# Altium footprint library Global Library.PcbLib: 82 footprints (part 5 of 6)
Each footprint in its own frame and in the unit in brackets; x right, y up, seen from the top. Pads: shape width x height; smd on the part's side, far side on the other; paste and mask are expansions set on the pad; w line width, h text height; cw(c..) or ccw(c..) is an arc to the next point about the centre after c.
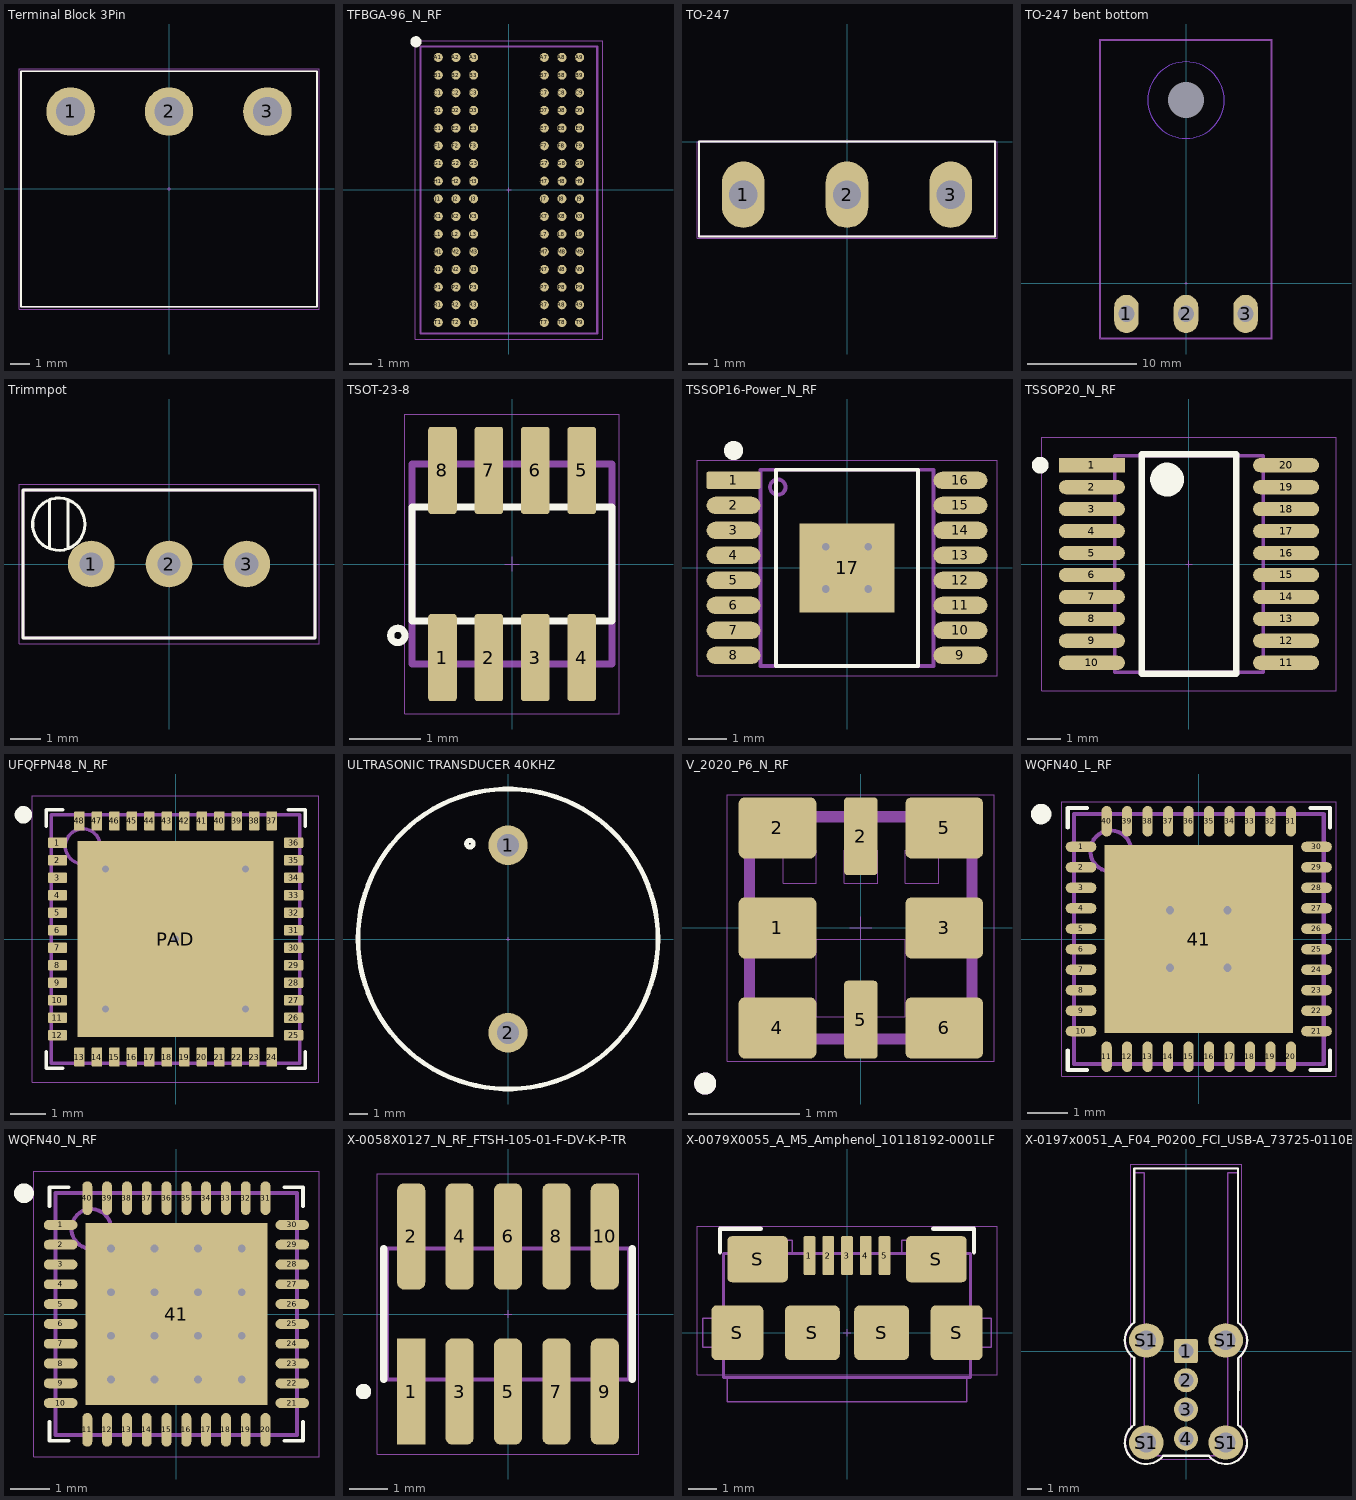
[diagram p4: the footprints below, top view; thin cyan lines are the x and y axes]

## Terminal Block 3Pin [mm]
pads (3):
  round 2.5 hole 1.5: 1(-5.08,4) 2(0,4) 3(5.08,4)
Top Overlay:
  lines w0.1: -7.64,-6.075 7.64,-6.075 7.64,6.075 -7.64,6.075 -7.64,-6.075
Top Courtyard:
  lines w0.01: -0.1,0 0.1,0 ; 0,-0.1 0,0.1 ; -7.74,-6.2 -7.74,6.2 7.74,6.2 7.74,-6.2 -7.74,-6.2
Top Assembly:
  lines w0.1: -7.64,-6.075 7.64,-6.075 7.64,6.075 -7.64,6.075 -7.64,-6.075
Top Assy THT:
  lines w0.1: -7.64,-6.075 7.64,-6.075 7.64,6.075 -7.64,6.075 -7.64,-6.075
  text ".Designator" at -8,-6 h1
3D body "691312510003 (rev1).stp": height 8.45, standoff -3.55, extent -7.62,-6 7.62,6

## TFBGA-96_N_RF [mm] "BGA, 96-Leads, Body 8.00x13.00mmx1.20mm, Pitch 0.80mm"
height 1.2
pads (96):
  round 0.41 smd: A1(-3.2,6) A2(-2.4,6) A3(-1.6,6) A7(1.6,6) A8(2.4,6) A9(3.2,6) B1(-3.2,5.2) B2(-2.4,5.2) B3(-1.6,5.2) B7(1.6,5.2) B8(2.4,5.2) B9(3.2,5.2) C1(-3.2,4.4) C2(-2.4,4.4) C3(-1.6,4.4) C7(1.6,4.4) C8(2.4,4.4) C9(3.2,4.4) D1(-3.2,3.6) D2(-2.4,3.6) D3(-1.6,3.6) D7(1.6,3.6) D8(2.4,3.6) D9(3.2,3.6) E1(-3.2,2.8) E2(-2.4,2.8) E3(-1.6,2.8) E7(1.6,2.8) E8(2.4,2.8) E9(3.2,2.8) F1(-3.2,2) F2(-2.4,2) F3(-1.6,2) F7(1.6,2) F8(2.4,2) F9(3.2,2) G1(-3.2,1.2) G2(-2.4,1.2) G3(-1.6,1.2) G7(1.6,1.2) G8(2.4,1.2) G9(3.2,1.2) H1(-3.2,0.4) H2(-2.4,0.4) H3(-1.6,0.4) H7(1.6,0.4) H8(2.4,0.4) H9(3.2,0.4) J1(-3.2,-0.4) J2(-2.4,-0.4) J3(-1.6,-0.4) J7(1.6,-0.4) J8(2.4,-0.4) J9(3.2,-0.4) K1(-3.2,-1.2) K2(-2.4,-1.2) K3(-1.6,-1.2) K7(1.6,-1.2) K8(2.4,-1.2) K9(3.2,-1.2) L1(-3.2,-2) L2(-2.4,-2) L3(-1.6,-2) L7(1.6,-2) L8(2.4,-2) L9(3.2,-2) M1(-3.2,-2.8) M2(-2.4,-2.8) M3(-1.6,-2.8) M7(1.6,-2.8) M8(2.4,-2.8) M9(3.2,-2.8) N1(-3.2,-3.6) N2(-2.4,-3.6) N3(-1.6,-3.6) N7(1.6,-3.6) N8(2.4,-3.6) N9(3.2,-3.6) P1(-3.2,-4.4) P2(-2.4,-4.4) P3(-1.6,-4.4) P7(1.6,-4.4) P8(2.4,-4.4) P9(3.2,-4.4) R1(-3.2,-5.2) R2(-2.4,-5.2) R3(-1.6,-5.2) R7(1.6,-5.2) R8(2.4,-5.2) R9(3.2,-5.2) T1(-3.2,-6) T2(-2.4,-6) T3(-1.6,-6) T7(1.6,-6) T8(2.4,-6) T9(3.2,-6)
Top Overlay:
  circle w0.25: c-4.21,6.71 r0.125
Top Courtyard:
  lines w0.01: -0.1,0 0.1,0 ; 0,-0.1 0,0.1 ; -4.25,-6.75 4.25,-6.75 4.25,6.75 -4.25,6.75 -4.25,-6.75
Top Assembly:
  lines w0.1: -4,-6.5 4,-6.5 4,6.5 -4,6.5 -4,-6.5
Top Assy SMT:
  lines w0.1: -4,-6.5 -4,6.5 4,6.5 4,-6.5 -4,-6.5
  text ".Designator" at -4.135,6.875 h1
3D body "TFBGA-96_N_RF.step": height 1.2, standoff 0, extent -4,-6.5 4,6.5

## TO-247 [mm]
pads (3):
  oval 2.25x3.5 hole 1.5: 1(-5.46,-2.8) 2(0,-2.8) 3(5.46,-2.8)
Top Overlay:
  lines w0.1: -7.8,-5 -7.8,0 7.8,0 7.8,-5 -7.8,-5
Top Courtyard:
  lines w0.01: -0.1,0 0.1,0 ; 0,-0.1 0,0.1 ; -7.9,-5.1 7.9,-5.1 7.9,0 -7.9,0 -7.9,-5.1
Top Assembly:
  lines w0.1: -7.8,-5 7.8,-5 7.8,0 -7.8,0 -7.8,-5
Top Assy THT:
  lines w0.1: -7.8,-5 7.8,-5 7.8,0 -7.8,0 -7.8,-5
  text ".Designator" at -7.7,-5.8 h1
3D body "TO-247_factory.stp": height 28.3, standoff -14.4, extent -7.8,-5 7.8,0

## TO-247 bent bottom [mm]
pads (4):
  oval 2.25x3.5 hole 1.5: 1(-5.46,-2.8) 2(0,-2.8) 3(5.46,-2.8)
  round 0 hole 3.3 unplated: ""(0,16.8)
Top Layer keep-out:
  circle w0.1: c0,16.8 r3.5
Bottom Layer keep-out:
  circle w0.1: c0,16.8 r3.5
Bottom Overlay:
  lines w0.1: -7.8,-5 7.8,-5 7.8,22.3 -7.8,22.3 -7.8,-5
Top Courtyard:
  lines w0.01: -0.1,0 0.1,0 ; 0,-0.1 0,0.1 ; -7.9,-5.1 -7.9,22.4 7.9,22.4 7.9,-5.1 -7.9,-5.1
Top Assembly:
  lines w0.1: -7.8,-5 -7.8,22.3 7.8,22.3 7.8,-5 -7.8,-5
Top Assy THT:
  lines w0.1: -7.8,-5 -7.8,22.3 7.8,22.3 7.8,-5 -7.8,-5
  text ".Designator" at -7.7,-5.8 h1
3D body "User Library-TO-247H.step": height 6.4, standoff -5.5, extent -7.75,-3.1 7.75,22.3

## Trimmpot [mil]
pads (3):
  round 60 hole 30: 1(-100,0) 2(0,0) 3(100,0)
Top Overlay:
  circle w3.94: c-141.73,51.18 r33.64
  lines w3.94: -153.54,19.68 -153.54,82.68 ; -129.92,19.68 -129.92,82.68 ; -187.6,-95.08 187.6,-95.08 187.6,95.08 -187.6,95.08 -187.6,-95.08
Top Courtyard:
  lines w0.39: -3.94,0 3.94,0 ; 0,-3.94 0,3.94 ; -192.91,-102.36 192.91,-102.36 192.91,102.36 -192.91,102.36 -192.91,-102.36
Top Assembly:
  lines w3.94: -187.6,-95.08 187.6,-95.08 187.6,95.08 -187.6,95.08 -187.6,-95.08
Top Assy SMT:
  lines w3.94: -187.6,-95.08 187.6,-95.08 187.6,95.08 -187.6,95.08 -187.6,-95.08
Top Assy THT:
  text ".Designator" at -187.6,110.24 h39.37
3D body "3296w-1-332lf.stp": height 233.61, standoff -473.39, extent -187.5,-94.49 187.5,95.51

## TSOT-23-8 [mm]
pads (8):
  rrect20% 0.4x1.22 smd: 1(-0.975,-1.31) 2(-0.325,-1.31) 3(0.325,-1.31) 4(0.975,-1.31) 5(0.975,1.31) 6(0.325,1.31) 7(-0.325,1.31) 8(-0.975,1.31)
Top Overlay:
  circle w0.1: c-1.6,-1 r0.1
  lines w0.1: -1.4,-0.8 -1.4,0.8 1.4,0.8 1.4,-0.8 -1.4,-0.8
Top Courtyard:
  lines w0.01: -0.1,0 0.1,0 ; 0,-0.1 0,0.1 ; -1.5,-2.1 1.5,-2.1 1.5,2.1 -1.5,2.1 -1.5,-2.1
Top Assembly:
  lines w0.1: -1.4,-1.4 1.4,-1.4 1.4,1.4 -1.4,1.4 -1.4,-1.4
Top Assy SMT:
  lines w0.1: -1.4,-1.4 -1.4,1.4 1.4,1.4 1.4,-1.4 -1.4,-1.4
  text ".Designator" at -1.136,-0.283 h1
3D body "TSOT-8.step": height 1, standoff 0, extent -1.45,-1.4 1.45,1.4

## TSSOP16-Power_N_RF [mm] "TSSOP, 16-Leads, Body 5.00x4.40mm, Pitch 0.65mm, Thermal Pad 2.31x2.46mm, IPC Medium Density"
height 1.2
pads (17):
  rrect20% 1.4x0.45 smd: 1(-2.95,2.275)
  oval 1.4x0.45 smd: 2(-2.95,1.625) 3(-2.95,0.975) 4(-2.95,0.325) 5(-2.95,-0.325) 6(-2.95,-0.975) 7(-2.95,-1.625) 8(-2.95,-2.275) 9(2.95,-2.275) 10(2.95,-1.625) 11(2.95,-0.975) 12(2.95,-0.325) 13(2.95,0.325) 14(2.95,0.975) 15(2.95,1.625) 16(2.95,2.275)
  rect 2.46x2.31 smd: 17(0,0)
via -0.55,0.55 diameter 0.5 hole 0.2
via 0.55,0.55 diameter 0.5 hole 0.2
via -0.55,-0.55 diameter 0.5 hole 0.2
via 0.55,-0.55 diameter 0.5 hole 0.2
Top Overlay:
  circle w0.25: c-2.95,3.05 r0.125
  lines w0.1: -1.85,-2.55 -1.85,2.55 1.85,2.55 1.85,-2.55 -1.85,-2.55
Top Courtyard:
  lines w0.01: -0.1,0 0.1,0 ; 0,-0.1 0,0.1 ; -3.9,-2.8 -3.9,2.8 3.9,2.8 3.9,-2.8 -3.9,-2.8
Top Assembly:
  circle w0.1: c-1.8,2.1 r0.2
  lines w0.1: -2.25,-2.55 -2.25,2.55 2.25,2.55 2.25,-2.55 -2.25,-2.55
Top Assy SMT:
  circle w0.1: c-1.8,2.1 r0.2
  lines w0.1: -2.25,-2.55 -2.25,2.55 2.25,2.55 2.25,-2.55 -2.25,-2.55
  text ".Designator" at -2.4,2.988 h1
3D body "TSSOP16-Power_N_RF.step": height 1.2, standoff 0, extent -3.2,-2.55 3.2,2.55

## TSSOP20_N_RF [mm]
height 3
pads (20):
  rect 1.955x0.421 smd mask+0.05: 1(-2.875,2.925)
  rrect100% 1.955x0.421 smd mask+0.05: 2(-2.875,2.275) 3(-2.875,1.625) 4(-2.875,0.975) 5(-2.875,0.325) 6(-2.875,-0.325) 7(-2.875,-0.975) 8(-2.875,-1.625) 9(-2.875,-2.275) 10(-2.875,-2.925) 11(2.875,-2.925) 12(2.875,-2.275) 13(2.875,-1.625) 14(2.875,-0.975) 15(2.875,-0.325) 16(2.875,0.325) 17(2.875,0.975) 18(2.875,1.625) 19(2.875,2.275) 20(2.875,2.925)
Top Overlay:
  circle w0.25: c-4.403,2.925 r0.125
  circle w0.5: c-0.648,2.5 r0.25
  lines w0.2: -1.398,-3.25 -1.398,3.25 1.398,3.25 1.398,-3.25 -1.398,-3.25
Top Courtyard:
  lines w0.01: -0.1,0 0.1,0 ; 0,-0.1 0,0.1 ; -4.353,-3.75 -4.353,3.75 4.353,3.75 4.353,-3.75 -4.353,-3.75
Top Assembly:
  lines w0.1: -2.2,-3.2 -2.2,3.2 2.2,3.2 2.2,-3.2 -2.2,-3.2
Top Assy SMT:
  lines w0.1: -2.2,-3.2 -2.2,3.2 2.2,3.2 2.2,-3.2 -2.2,-3.2
  text ".Designator" at -1.8,3.488 h1
3D body "IC_STMicroelectronics_STM32G030F6P6_eec.STEP": height 0.25, standoff 0, extent -4.353,-3.75 4.353,3.75

## UFQFPN48_N_RF [mm] "QFN, 48-Leads, Body 7.00x7.00mm, Pitch 0.50mm, Thermal Pad 5.60x5.60mm, IPC Medium Density"
height 0.6
pads (49):
  rrect20% 0.55x0.3 smd: 1(-3.375,2.75) 2(-3.375,2.25) 3(-3.375,1.75) 4(-3.375,1.25) 5(-3.375,0.75) 6(-3.375,0.25) 7(-3.375,-0.25) 8(-3.375,-0.75) 9(-3.375,-1.25) 10(-3.375,-1.75) 11(-3.375,-2.25) 12(-3.375,-2.75) 25(3.375,-2.75) 26(3.375,-2.25) 27(3.375,-1.75) 28(3.375,-1.25) 29(3.375,-0.75) 30(3.375,-0.25) 31(3.375,0.25) 32(3.375,0.75) 33(3.375,1.25) 34(3.375,1.75) 35(3.375,2.25) 36(3.375,2.75)
  rrect20% 0.3x0.55 smd: 13(-2.75,-3.375) 14(-2.25,-3.375) 15(-1.75,-3.375) 16(-1.25,-3.375) 17(-0.75,-3.375) 18(-0.25,-3.375) 19(0.25,-3.375) 20(0.75,-3.375) 21(1.25,-3.375) 22(1.75,-3.375) 23(2.25,-3.375) 24(2.75,-3.375) 37(2.75,3.375) 38(2.25,3.375) 39(1.75,3.375) 40(1.25,3.375) 41(0.75,3.375) 42(0.25,3.375) 43(-0.25,3.375) 44(-0.75,3.375) 45(-1.25,3.375) 46(-1.75,3.375) 47(-2.25,3.375) 48(-2.75,3.375)
  rect 5.6x5.6 smd: PAD(0,0)
via 0,0 diameter 0.5 hole 0.2
via -2,-2 diameter 0.5 hole 0.2
via 2,-2 diameter 0.5 hole 0.2
via 2,2 diameter 0.5 hole 0.2
via -2,2 diameter 0.5 hole 0.2
Top Overlay:
  circle w0.25: c-4.35,3.55 r0.125
  lines w0.1: -3.7,-3.225 -3.7,-3.7 -3.225,-3.7 ; -3.7,3.225 -3.7,3.7 -3.225,3.7 ; 3.225,-3.7 3.7,-3.7 3.7,-3.225 ; 3.225,3.7 3.7,3.7 3.7,3.225
Top Courtyard:
  lines w0.01: -0.1,0 0.1,0 ; 0,-0.1 0,0.1 ; -4.1,-4.1 -4.1,4.1 4.1,4.1 4.1,-4.1 -4.1,-4.1
Top Assembly:
  circle w0.1: c-2.65,2.65 r0.5
  lines w0.1: -3.55,-3.55 -3.55,3.55 3.55,3.55 3.55,-3.55 -3.55,-3.55
Top Assy SMT:
  text ".Designator" at -3.835,4.275 h1
3D body "UFQFPN48_N_RF.step": height 0.6, standoff 0, extent -3.551,-3.551 3.551,3.551

## ULTRASONIC TRANSDUCER 40KHZ [mm]
pads (2):
  round 2.1 hole 1.2: 1(0,5) 2(0,-5)
Top Overlay:
  circle w0.254: c0,0 r8
  circle w0.254: c-2.032,5.08 r0.18
Top Courtyard:
  circle w0.01: c0,0 r8
  lines w0.01: -0.1,0 0.1,0 ; 0,-0.1 0,0.1

## V_2020_P6_N_RF [mm] "APA102C LED"
pads (8):
  rrect20% 0.7x0.55 smd mask+0.05: 1(-0.75,0) 2(-0.75,0.9) 3(0.75,0) 4(-0.75,-0.9) 5(0.75,0.9) 6(0.75,-0.9)
  rrect20% 0.3x0.7 smd mask+0.05: 2(0,0.825) 5(0,-0.825)
Top Overlay:
  circle w0.1: c-1.4,-1.4 r0.049
Top Courtyard:
  lines w0.01: -0.1,0 0.1,0 ; 0,-0.1 0,0.1 ; -1.2,-1.2 1.2,-1.2 1.2,1.2 -1.2,1.2 -1.2,-1.2
Top Assembly:
  circle w0.1: c-1.4,-1.4 r0.049
  lines w0.01: -0.7,0.4 -0.7,0.7 -0.4,0.7 -0.4,0.4 -0.7,0.4 ; -0.4,-0.8 -0.4,-0.1 0.4,-0.1 0.4,-0.8 -0.4,-0.8 ; -0.15,0.4 -0.15,0.7 0.15,0.7 0.15,0.4 -0.15,0.4 ; 0.4,0.4 0.4,0.7 0.7,0.7 0.7,0.4 0.4,0.4
  lines w0.1: -1,-1 1,-1 1,1 -1,1 -1,-1
Top Assy SMT:
  circle w0.1: c-1.4,-1.4 r0.049
  lines w0.1: -1,-1 -1,1 1,1 1,-1 -1,-1
  text ".Designator" at -1.1,1.5 h1
3D body: height 0.15, standoff 0, extent -1,-1 1,1
3D body: height 0.6, standoff 0.15, extent -1,-1 1,1

## WQFN40_L_RF [mm] "QFN, 40-Leads, Body 6.00x6.00mm, Pitch 0.50mm, Thermal Pad 4.60x4.60mm, IPC High Density"
height 0.8
pads (41):
  oval 0.75x0.25 smd: 1(-2.875,2.25) 2(-2.875,1.75) 3(-2.875,1.25) 4(-2.875,0.75) 5(-2.875,0.25) 6(-2.875,-0.25) 7(-2.875,-0.75) 8(-2.875,-1.25) 9(-2.875,-1.75) 10(-2.875,-2.25) 21(2.875,-2.25) 22(2.875,-1.75) 23(2.875,-1.25) 24(2.875,-0.75) 25(2.875,-0.25) 26(2.875,0.25) 27(2.875,0.75) 28(2.875,1.25) 29(2.875,1.75) 30(2.875,2.25)
  oval 0.25x0.75 smd: 11(-2.25,-2.875) 12(-1.75,-2.875) 13(-1.25,-2.875) 14(-0.75,-2.875) 15(-0.25,-2.875) 16(0.25,-2.875) 17(0.75,-2.875) 18(1.25,-2.875) 19(1.75,-2.875) 20(2.25,-2.875) 31(2.25,2.875) 32(1.75,2.875) 33(1.25,2.875) 34(0.75,2.875) 35(0.25,2.875) 36(-0.25,2.875) 37(-0.75,2.875) 38(-1.25,2.875) 39(-1.75,2.875) 40(-2.25,2.875)
  rect 4.6x4.6 smd: 41(0,0)
via -0.7,-0.7 diameter 0.55 hole 0.2
via 0.7,0.7 diameter 0.55 hole 0.2
via 0.7,-0.7 diameter 0.55 hole 0.2
via -0.7,0.7 diameter 0.55 hole 0.2
Top Overlay:
  circle w0.25: c-3.85,3.05 r0.125
  lines w0.1: -3.2,-2.725 -3.2,-3.2 -2.725,-3.2 ; -3.2,2.725 -3.2,3.2 -2.725,3.2 ; 2.725,-3.2 3.2,-3.2 3.2,-2.725 ; 2.725,3.2 3.2,3.2 3.2,2.725
Top Courtyard:
  lines w0.01: -0.1,0 0.1,0 ; 0,-0.1 0,0.1 ; -3.35,-3.35 3.35,-3.35 3.35,3.35 -3.35,3.35 -3.35,-3.35
Top Assembly:
  circle w0.1: c-2.15,2.15 r0.5
  lines w0.1: -3.05,-3.05 3.05,-3.05 3.05,3.05 -3.05,3.05 -3.05,-3.05
Top Assy SMT:
  text ".Designator" at -3.342,3.579 h1
3D body "WQFN40_L_RF.step": height 0.8, standoff 0, extent -3.051,-3.051 3.051,3.051

## WQFN40_N_RF [mm] "QFN, 40-Leads, Body 6.00x6.00mm, Pitch 0.50mm, Thermal Pad 4.60x4.60mm, IPC Medium Density"
height 0.8
pads (41):
  oval 0.85x0.25 smd: 1(-2.925,2.25) 2(-2.925,1.75) 3(-2.925,1.25) 4(-2.925,0.75) 5(-2.925,0.25) 6(-2.925,-0.25) 7(-2.925,-0.75) 8(-2.925,-1.25) 9(-2.925,-1.75) 10(-2.925,-2.25) 21(2.925,-2.25) 22(2.925,-1.75) 23(2.925,-1.25) 24(2.925,-0.75) 25(2.925,-0.25) 26(2.925,0.25) 27(2.925,0.75) 28(2.925,1.25) 29(2.925,1.75) 30(2.925,2.25)
  oval 0.25x0.85 smd: 11(-2.25,-2.925) 12(-1.75,-2.925) 13(-1.25,-2.925) 14(-0.75,-2.925) 15(-0.25,-2.925) 16(0.25,-2.925) 17(0.75,-2.925) 18(1.25,-2.925) 19(1.75,-2.925) 20(2.25,-2.925) 31(2.25,2.925) 32(1.75,2.925) 33(1.25,2.925) 34(0.75,2.925) 35(0.25,2.925) 36(-0.25,2.925) 37(-0.75,2.925) 38(-1.25,2.925) 39(-1.75,2.925) 40(-2.25,2.925)
  rect 4.6x4.6 smd: 41(0,0)
via 1.65,-1.65 diameter 0.5 hole 0.2
via 0.55,-1.65 diameter 0.5 hole 0.2
via -0.55,-1.65 diameter 0.5 hole 0.2
via -1.65,-1.65 diameter 0.5 hole 0.2
via 1.65,-0.55 diameter 0.5 hole 0.2
via 0.55,-0.55 diameter 0.5 hole 0.2
via -0.55,-0.55 diameter 0.5 hole 0.2
via -1.65,-0.55 diameter 0.5 hole 0.2
via 1.65,0.55 diameter 0.5 hole 0.2
via 0.55,0.55 diameter 0.5 hole 0.2
via -0.55,0.55 diameter 0.5 hole 0.2
via -1.65,0.55 diameter 0.5 hole 0.2
via 1.65,1.65 diameter 0.5 hole 0.2
via 0.55,1.65 diameter 0.5 hole 0.2
via -0.55,1.65 diameter 0.5 hole 0.2
via -1.65,1.65 diameter 0.5 hole 0.2
Top Overlay:
  circle w0.25: c-3.85,3.05 r0.125
  lines w0.1: -3.2,-2.725 -3.2,-3.2 -2.725,-3.2 ; -3.2,2.725 -3.2,3.2 -2.725,3.2 ; 2.725,-3.2 3.2,-3.2 3.2,-2.725 ; 2.725,3.2 3.2,3.2 3.2,2.725
Top Courtyard:
  lines w0.01: -0.1,0 0.1,0 ; 0,-0.1 0,0.1 ; -3.6,-3.6 3.6,-3.6 3.6,3.6 -3.6,3.6 -3.6,-3.6
Top Assembly:
  circle w0.1: c-2.15,2.15 r0.5
  lines w0.1: -3.05,-3.05 3.05,-3.05 3.05,3.05 -3.05,3.05 -3.05,-3.05
Top Assy SMT:
  text ".Designator" at -3.742,3.779 h1
3D body "WQFN40_N_RF.step": height 0.8, standoff 0, extent -3.051,-3.051 3.051,3.051

## X-0058X0127_N_RF_FTSH-105-01-F-DV-K-P-TR [mm] "2x5 pin connector 1.27mm pitch samtec"
pads (10):
  rect 0.74x2.79 smd: 1(-2.54,-2.035)
  rrect50% 0.74x2.79 smd: 2(-2.54,2.035) 3(-1.27,-2.035) 4(-1.27,2.035) 5(0,-2.035) 6(0,2.035) 7(1.27,-2.035) 8(1.27,2.035) 9(2.54,-2.035) 10(2.54,2.035)
Top Overlay:
  circle w0.2: c-3.79,-2.035 r0.1
  lines w0.2: -3.26,-1.715 -3.26,1.715 ; 3.26,-1.715 3.26,1.715
Top Courtyard:
  lines w0.01: -0.1,0 0.1,0 ; 0,-0.1 0,0.1 ; -3.425,-3.68 -3.425,3.68 3.425,3.68 3.425,-3.68 -3.425,-3.68
Top Assembly:
  circle w0.2: c-3.79,-2.035 r0.1
  lines w0.1: -3.175,-1.715 3.175,-1.715 3.175,1.715 -3.175,1.715 -3.175,-1.715
Top Assy SMT:
  circle w0.2: c-3.79,-2.035 r0.1
  lines w0.1: -3.175,-1.715 3.175,-1.715 3.175,1.715 -3.175,1.715 -3.175,-1.715
  text ".Designator" at 4.424,-3.8 h1.52
3D body "FTSH-105-01-F-DV-K-P.stp": height 6.98, standoff -0.01, extent -3.175,-2.921 3.175,2.921

## X-0079X0055_A_M5_Amphenol_10118192-0001LF [mm]
height 2.7
pads (11):
  rrect20% 0.4x1.35 smd: 1(-1.3,2.675) 2(-0.65,2.675) 3(0,2.675) 4(0.65,2.675) 5(1.3,2.675)
  rrect20% 1.8x1.9 smd: S(-3.8,0) S(3.8,0)
  rrect20% 2.1x1.6 smd: S(-3.1,2.55) S(3.1,2.55)
  rrect20% 1.9x1.9 smd: S(-1.2,0) S(1.2,0)
Top Overlay:
  lines w0.15: -4.4,2.793 -4.4,3.6 -2.99,3.6 ; 2.99,3.6 4.4,3.6 4.4,2.793
Top Courtyard:
  lines w0.01: -0.125,0 0.125,0 ; 0,-0.125 0,0.125 ; -5.2,-1.45 -5.2,3.7 5.2,3.7 5.2,-1.45 -5.2,-1.45
Top Assembly:
  lines w0.05: -4.277,-0.5 -5,-0.5 -5,0.5 -4.25,0.5 ; -4.15,-1.55 -4.15,-2.4 4.15,-2.4 4.15,-1.55 ; -2.4,2.75 -2.4,3.2 -1.896,3.2 -1.896,2.75 ; -1.425,2.75 -1.425,3.2 -1.175,3.2 -1.175,2.75 ; -0.775,2.75 -0.775,3.2 -0.525,3.2 -0.525,2.75 ; -0.125,2.75 -0.125,3.2 0.125,3.2 0.125,2.75 ; 0.525,2.75 0.525,3.2 0.775,3.2 0.775,2.75 ; 1.175,2.75 1.175,3.2 1.425,3.2 1.425,2.75 ; 1.9,2.75 1.9,3.2 2.404,3.2 2.404,2.75 ; 4.277,-0.5 5,-0.5 5,0.5 4.277,0.5
  lines w0.1: -4.277,-1.55 -4.277,2.75 4.277,2.75 4.277,-1.55 -4.277,-1.55
Top Assy SMT:
  lines w0.05: -4.277,-0.5 -5,-0.5 -5,0.5 -4.25,0.5 ; -4.15,-1.55 -4.15,-2.4 4.15,-2.4 4.15,-1.55 ; 4.277,-0.5 5,-0.5 5,0.5 4.277,0.5 ; -2.4,3.2 -2.4,2.75 -2.4,3.2 ; -2.4,3.2 -1.896,3.2 ; -2.4,3.2 -1.896,3.2 ; -1.896,3.2 -1.896,2.75 -1.896,3.2 ; -1.425,3.2 -1.175,3.2 ; -1.425,3.2 -1.425,2.75 -1.425,3.2 ; -1.425,3.2 -1.175,3.2 ; -1.175,3.2 -1.175,2.75 -1.175,3.2 ; -0.775,3.2 -0.775,2.75 -0.775,3.2 ; -0.775,3.2 -0.525,3.2 ; -0.775,3.2 -0.525,3.2 ; -0.525,3.2 -0.525,2.75 -0.525,3.2 ; -0.125,3.2 -0.125,2.75 -0.125,3.2 ; -0.125,3.2 0.125,3.2 ; -0.125,3.2 0.125,3.2 ; 0.125,3.2 0.125,2.75 0.125,3.2 ; 0.525,3.2 0.525,2.75 0.525,3.2 ; 0.525,3.2 0.775,3.2 ; 0.525,3.2 0.775,3.2 ; 0.775,3.2 0.775,2.75 0.775,3.2 ; 1.175,3.2 1.425,3.2 ; 1.175,3.2 1.175,2.75 1.175,3.2 ; 1.175,3.2 1.425,3.2 ; 1.425,3.2 1.425,2.75 1.425,3.2 ; 1.9,3.2 2.404,3.2 ; 1.9,3.2 1.9,2.75 1.9,3.2 ; 1.9,3.2 2.404,3.2 ; 2.404,3.2 2.404,2.75 2.404,3.2
  lines w0.1: -4.277,-1.55 -4.277,2.75 4.277,2.75 4.277,-1.55 -4.277,-1.55
  text ".Designator" at -5.25,-1.75 h2
3D body "10118192C.stp": height 2.79, standoff -0.22, extent -3.957,-2.596 3.955,3.065

## X-0197x0051_A_F04_P0200_FCI_USB-A_73725-0110BLF - duplicate [mm] "TE-USB-A, Female. 180°_0-5787834-2"
height 12.5
pads (8):
  rrect20% 1.65x1.65 hole 1: 1(0,0)
  round 1.65 hole 1: 2(0,-2) 3(0,-4) 4(0,-6)
  round 2.36 hole 1.35: S1(-2.72,-6.27) S1(-2.72,0.73) S1(2.72,-6.27) S1(2.72,0.73)
Top Overlay:
  lines w0.15: -3.561,-0.479 cw(c-2.72,0.73) -3.55,1.946 -3.55,12.52 3.57,12.52 3.57,1.932 cw(c2.72,0.73) 3.575,-0.469 3.57,-5.061 ; -3.551,-0.465 -3.55,-5.054 ccw(c-2.72,-6.27) -1.563,-7.181 1.569,-7.18 ; 1.565,-7.183 ccw(c2.72,-6.27) 3.561,-5.061
Top Courtyard:
  lines w0.01: -0.1,0 0.1,0 ; 0,-0.1 0,0.1 ; 3.82,-5.358 3.82,-0.183 ccw(c2.72,0.73) 3.821,1.643 3.82,12.82 -3.8,12.82 -3.8,1.667 ccw(c-2.72,0.73) -3.8,-0.207 -3.8,-5.333 ccw(c-2.72,-6.27) -1.885,-7.431 1.884,-7.43 ccw(c2.72,-6.27) 3.821,-5.358
Top Assembly:
  lines w0.1: -3.55,12.22 -3.55,12.52 3.57,12.52 3.57,12.22 2.87,12.22 2.87,-7.18 -2.85,-7.18 -2.85,12.22 -3.55,12.22
Top Assy THT:
  lines w0.1: -3.55,12.22 -3.55,12.52 3.57,12.52 3.57,12.22 2.87,12.22 2.87,-7.18 -2.85,-7.18 -2.85,12.22 -3.55,12.22
  text ".Designator" at -3.807,13.315 h1.52
3D body "73725-0110BLFC.step": height 14.53, standoff -3.28, extent -3.55,-7.18 3.57,12.52